# Altium footprint library XU-GENARAL PCB .PcbLib: 1176 footprints (part 28 of 75)
Each footprint in its own frame and in the unit in brackets; x right, y up, seen from the top. Pads: shape width x height; smd on the part's side, far side on the other; paste and mask are expansions set on the pad; w line width, h text height; cw(c..) or ccw(c..) is an arc to the next point about the centre after c.
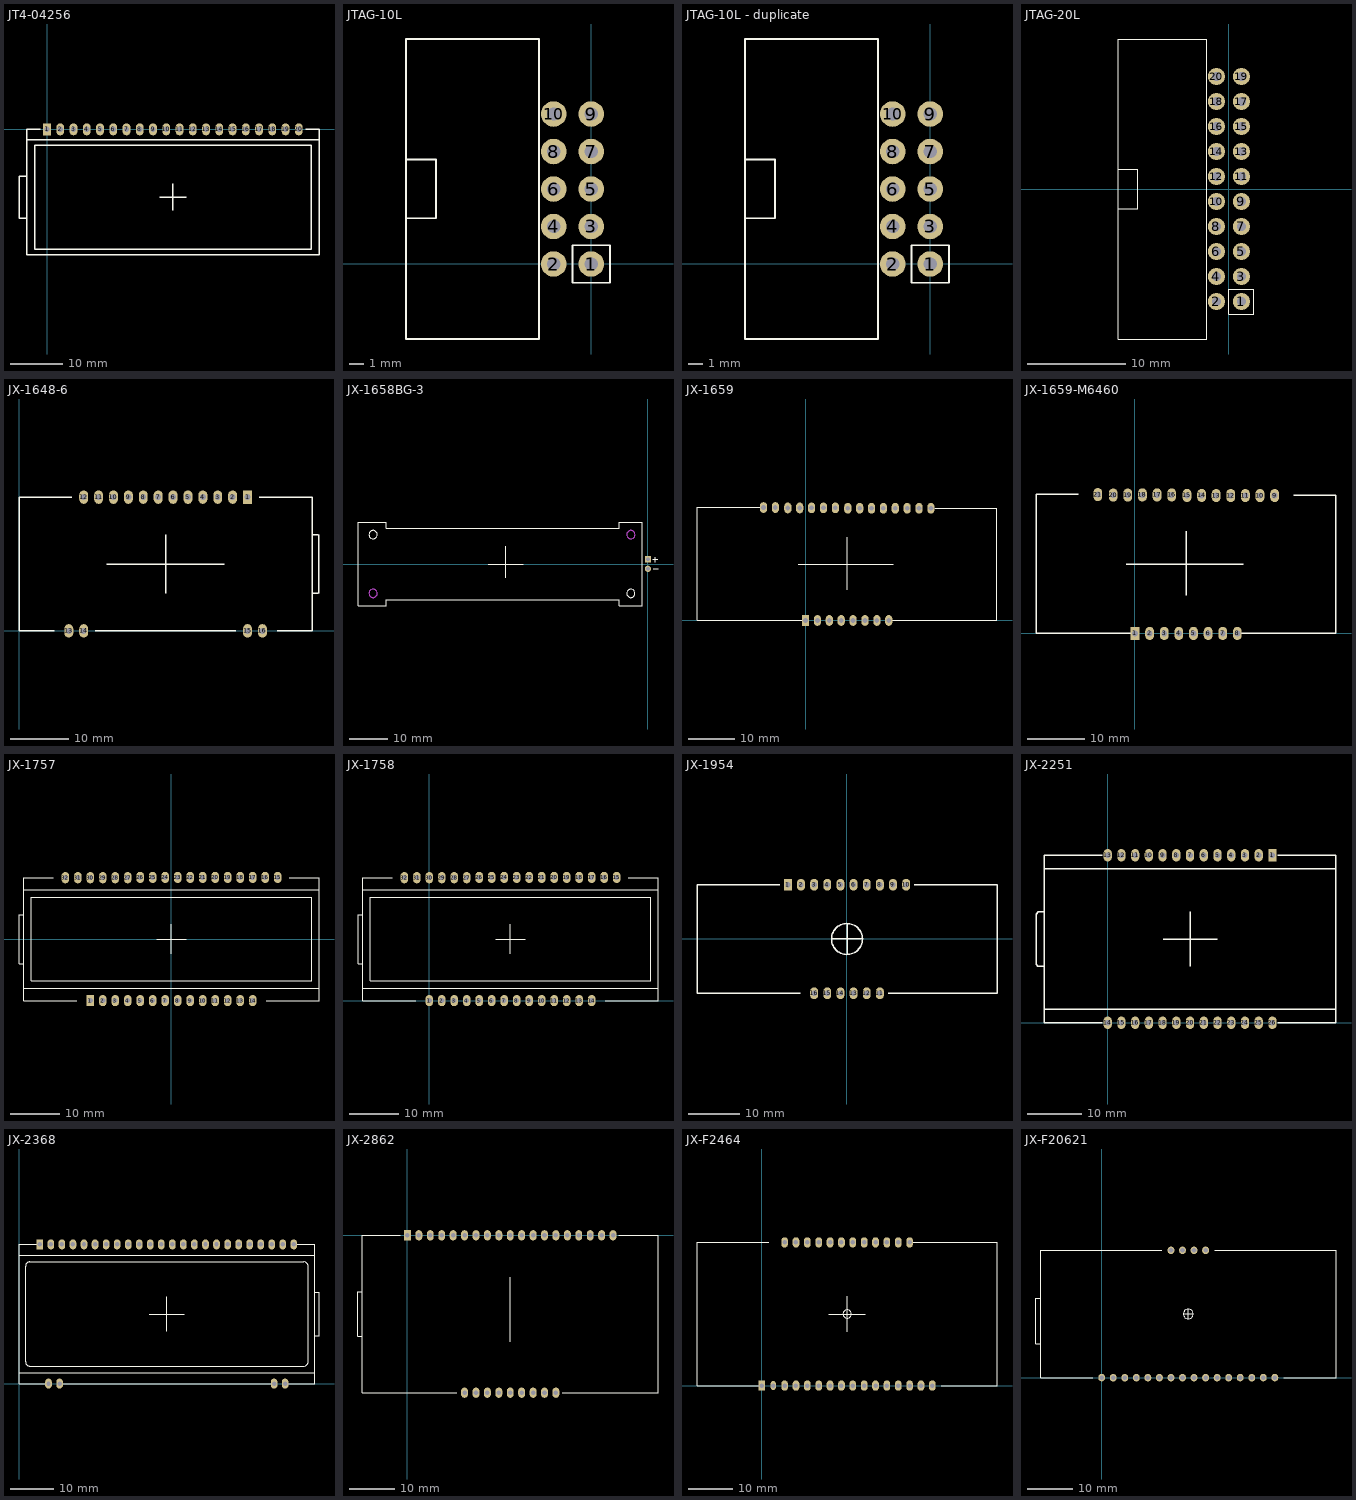
[diagram p27: the footprints below, top view; thin cyan lines are the x and y axes]

## JT4-04256 [mil]
pads (20):
  rect 59.05x90 hole 40: 1(0,0)
  oval 59.05x90 hole 40: 2(100,0) 3(200,0) 4(300,0) 5(400,0) 6(500,0) 7(600,0) 8(700,0) 9(800,0) 10(900,0) 11(1000,0) 12(1100,0) 13(1200,0) 14(1300,0) 15(1400,0) 16(1500,0) 17(1600,0) 18(1700,0) 19(1800,0) 20(1900,0)
Top Overlay:
  lines w10: -152.36,-669.29 -211.42,-669.29 -211.42,-354.33 -152.36,-354.33 ; -52.36,0 -152.36,0 -152.36,-78.74 ; 850,-511.81 1050,-511.81 ; 950,-611.81 950,-411.81 ; 1952.36,0 2052.36,0 2052.36,-78.74 ; -152.36,-78.74 -152.36,-944.88 2052.36,-944.88 2052.36,-78.74 ; -152.36,-78.74 2052.36,-78.74 ; -93.31,-905.51 1993.31,-905.51 1993.31,-118.11 -93.31,-118.11 -93.31,-905.51

## JTAG-10L [mil]
pads (10):
  round 68 hole 35: 1(0.06,-0.03) 2(-99.94,-0.03) 3(0.06,99.97) 4(-99.94,99.97) 5(0.06,199.97) 6(-99.94,199.97) 7(0.06,299.97) 8(-99.94,299.97) 9(0.06,399.97) 10(-99.94,399.97)
Top Overlay:
  lines w5: -493.64,-191.03 -493.64,-151.03 ; -493.64,121.97 -413.94,121.97 -413.94,278.97 -493.64,278.97 ; -493.64,-200.03 -139.31,-200.03 -139.31,599.97 -493.64,599.97 -493.64,-200.03 ; -49.94,-50.03 50.06,-50.03 50.06,49.97 -49.94,49.97 -49.94,-50.03

## JTAG-10L - duplicate [mil]
pads (10):
  round 68 hole 35: 1(0.06,-0.03) 2(-99.94,-0.03) 3(0.06,99.97) 4(-99.94,99.97) 5(0.06,199.97) 6(-99.94,199.97) 7(0.06,299.97) 8(-99.94,299.97) 9(0.06,399.97) 10(-99.94,399.97)
Top Overlay:
  lines w5: -493.64,-191.03 -493.64,-151.03 ; -493.64,121.97 -413.94,121.97 -413.94,278.97 -493.64,278.97 ; -493.64,-200.03 -139.31,-200.03 -139.31,599.97 -493.64,599.97 -493.64,-200.03 ; -49.94,-50.03 50.06,-50.03 50.06,49.97 -49.94,49.97 -49.94,-50.03

## JTAG-20L [mil]
pads (20):
  round 68 hole 35: 1(50,-450) 2(-50,-450) 3(50,-350) 4(-50,-350) 5(50,-250) 6(-50,-250) 7(50,-150) 8(-50,-150) 9(50,-50) 10(-50,-50) 11(50,50) 12(-50,50) 13(50,150) 14(-50,150) 15(50,250) 16(-50,250) 17(50,350) 18(-50,350) 19(50,450) 20(-50,450)
Top Overlay:
  lines w5: -443.7,-391 -443.7,-351 ; -443.7,-78 -364,-78 -364,79 -443.7,79 ; -443.7,-600 -443.7,600 -89.37,600 -89.37,-600 -443.7,-600 ; 0,-500 0,-400 100,-400 100,-500 0,-500

## JX-1648-6 [mil]
pads (16):
  rect 60x90 hole 40: 1(1534.25,897.64)
  oval 60x90 hole 40: 2(1434.25,897.64) 3(1334.25,897.64) 4(1234.25,897.64) 5(1134.25,897.64) 6(1034.25,897.64) 7(934.25,897.64) 8(834.25,897.64) 9(734.25,897.64) 10(634.25,897.64) 11(534.25,897.64) 12(434.25,897.64) 13(334.25,0) 14(434.25,0) 15(1534.25,0) 16(1634.25,0)
Top Overlay:
  lines w10: 0,0 236.22,0 ; 0.04,0 0.04,897.64 ; 0.16,897.64 354.33,897.64 ; 511.81,0 1456.69,0 ; 590.55,448.82 1377.95,448.82 ; 984.25,251.97 984.25,645.67 ; 1614.17,897.64 1968.5,897.64 1968.5,0 1732.28,0 ; 1968.5,251.97 2007.87,251.97 ; 1968.5,645.67 2007.87,645.67 ; 2014,251.97 2014,645.67

## JX-1658BG-3 [mil]
pads (2):
  rect 65x65 hole 40: A(0,50)
  round 65 hole 40: K(0,-50)
Top Overlay:
  circle w5: c-2854.31,305 r43.31
  circle w5: c-177.31,-305 r43.31
  lines w5: -1659,0 -1293,0 ; -1477,-145 -1477,183 -1477,0 ; 52,47 103,47 ; 57,-48 105,-48 ; 78,20 78,68 ; -3011.81,-433.07 -3011.81,433.07 -2716.54,433.07 -2716.54,374.02 -295.28,374.02 -295.28,433.07 -59.05,433.07 -59.05,-433.07 -295.28,-433.07 -295.28,-374.02 -2716.54,-374.02 -2716.54,-433.07 -3011.81,-433.07
Keep-Out Layer:
  circle w5: c-177.17,305.12 r43.31
  circle w5: c-2854.33,-305.12 r43.31
Mechanical 1:
  circle w5: c-2854.33,-305.12 r43.31
  circle w5: c-177.16,305.12 r43.31

## JX-1659 [mil]
pads (23):
  rect 60x90 hole 40: 1(0,0)
  oval 60x90 hole 40: 2(100,0) 3(200,0) 4(300,0) 5(400,0) 6(500,0) 7(600,0) 8(700,0) 9(1054.82,943.28) 10(954.82,943.28) 11(854.82,943.28) 12(754.82,943.28) 13(654.82,943.28) 14(554.82,943.28) 15(455.64,943.57) 16(355.64,943.57) 17(250.82,947.28) 18(150.82,947.28) 19(50.82,947.28) 20(-49.18,946.29) 21(-149.18,946.29) 22(-254,950) 23(-354,950)
Top Overlay:
  lines w10: -387.18,953.28 -913.06,953.28 -913.18,953.16 -913.18,943.28 -913.18,1.28 -911.9,0 0,0 ; -60,473.64 740,473.64 ; 350,260 350,700 ; 700,0 1609.54,0 1610.82,1.28 1610.82,945.28 1086.82,945.28

## JX-1659-M6460 [mil]
pads (21):
  rect 60x90 hole 40: 1(0,0)
  oval 60x90 hole 40: 2(100,0) 3(200,0) 4(300,0) 5(400,0) 6(500,0) 7(600,0) 8(700,0) 9(954.82,943.28) 10(854.82,943.28) 11(754.82,943.28) 12(654.82,943.28) 13(554.82,943.28) 14(455.64,943.57) 15(355.64,943.57) 16(250.82,947.28) 17(150.82,947.28) 18(50.82,947.28) 19(-49.18,946.29) 20(-149.18,946.29) 21(-254,950)
Top Overlay:
  lines w10: -676.96,1.28 -676.96,953.28 ; -676.84,953.28 -387.18,953.28 ; -675.68,0 0,0 ; -60,473.64 740,473.64 ; 350,260 350,700 ; 700,0 1373.32,0 ; 1086.82,945.28 1374.6,945.28 1374.6,1.28

## JX-1757 [mil]
pads (32):
  rect 60x90 hole 40: 1(-649.9,-492)
  oval 60x90 hole 40: 2(-549.9,-492) 3(-449.9,-492) 4(-349.9,-492) 5(-249.9,-492) 6(-149.9,-492) 7(-49.9,-492) 8(50.1,-492) 9(150.1,-492) 10(250.1,-492) 11(350.1,-492) 12(450.1,-492) 13(550.1,-492) 14(650.1,-492) 15(850.1,494.47) 16(750.1,494.47) 17(650.1,494.47) 18(550.1,494.47) 19(450.1,494.47) 20(350.1,494.47) 21(250.1,494.47) 22(150.1,494.47) 23(50.1,494.47) 24(-49.9,494.47) 25(-149.9,494.47) 26(-249.9,494.47) 27(-349.9,492.25) 28(-449.9,492.25) 29(-549.9,492.25) 30(-649.9,492.25) 31(-749.9,492.25) 32(-849.9,492.25)
Top Overlay:
  lines w10: -1181,-196.72 -1220.37,-196.72 -1220.37,196.98 -1181,196.98 ; -944.78,492.25 -1181,492.25 -1181,393.83 ; -757.37,-492 -1181,-492 -1181,-393.57 ; -118.01,0.13 118.21,0.13 ; 0.1,-117.98 0.1,118.24 ; 757.38,-492 1181.2,-492 1181.2,-394.05 ; 944.98,492.25 1181.2,492.25 1181.2,393.83 ; 1122,-334.52 1122,334.77 ; 1122.15,-334.52 -1121.94,-334.52 -1121.94,334.77 1122.15,334.77 ; -1181,-393.57 1181.2,-393.57 1181.2,393.83 ; -1181,-393.57 -1181,393.83 ; -1181,393.83 1181.2,393.83

## JX-1758 [mil]
pads (32):
  oval 60x90 hole 40: 1(0,0) 2(100,0) 3(200,0) 4(300,0) 5(400,0) 6(500,0) 7(600,0) 8(700,0) 9(800,0) 10(900,0) 11(1000,0) 12(1100,0) 13(1200,0) 14(1300,0) 15(1500,986.47) 16(1400,986.47) 17(1300,986.47) 18(1200,986.47) 19(1100,986.47) 20(1000,986.47) 21(900,986.47) 22(800,986.47) 23(700,986.47) 24(600,986.47) 25(500,986.47) 26(400,986.47) 27(300,984.25) 28(200,984.25) 29(100,984.25) 30(0,984.25) 31(-100,984.25) 32(-200,984.25)
Top Overlay:
  lines w10: -531.1,295.28 -570.47,295.28 -570.47,688.98 -531.1,688.98 ; -294.88,984.25 -531.1,984.25 -531.1,885.83 ; -107.47,0 -531.1,0 -531.1,98.42 ; 531.89,492.13 768.11,492.13 ; 650,374.02 650,610.24 ; 1407.28,0 1831.1,0 1831.1,97.95 ; 1594.88,984.25 1831.1,984.25 1831.1,885.83 ; 1771.9,157.48 1771.9,826.77 ; 1772.05,157.48 -472.05,157.48 -472.05,826.77 1772.05,826.77 ; -531.1,98.42 1831.1,98.42 1831.1,885.83 ; -531.1,98.42 -531.1,885.83 ; -531.1,885.83 1831.1,885.83

## JX-1954 [mil]
pads (16):
  rect 60x90 hole 40: 1(-448.27,413.39)
  oval 60x90 hole 40: 2(-348.27,413.39) 3(-248.27,413.39) 4(-148.27,413.39) 5(-48.27,413.39) 6(51.73,413.39) 7(151.73,413.39) 8(251.73,413.39) 9(351.73,413.39) 10(451.73,413.39) 11(251.73,-413.39) 12(151.73,-413.39) 13(51.73,-413.39) 14(-48.27,-413.39) 15(-148.27,-413.39) 16(-248.27,-413.39)
Top Overlay:
  circle w10: c1.73,0 r118.11
  lines w10: -1140,-413.39 -352.6,-413.39 ; -1140,413.39 -510.08,413.39 ; -1139.96,-413.39 -1139.96,413.39 ; -116.38,0 119.84,0 ; 1.73,-118.11 1.73,118.11 ; 316.69,-413.39 1143.46,-413.39 1143.46,413.39 513.54,413.39

## JX-2251 [mil]
pads (26):
  rect 60x90 hole 40: 1(1200,1220.47)
  oval 60x90 hole 40: 2(1100,1220.47) 3(1000,1220.47) 4(900,1220.47) 5(800,1220.47) 6(700,1220.47) 7(600,1220.47) 8(500,1220.47) 9(400,1220.47) 10(300,1220.47) 11(200,1220.47) 12(100,1220.47) 13(0,1220.47) 14(0,0) 15(100,0) 16(200,0) 17(300,0) 18(400,0) 19(500,0) 20(600,0) 21(700,0) 22(800,0) 23(900,0) 24(1000,0) 25(1100,0) 26(1200,0)
Top Overlay:
  lines w10: -466.99,807.09 -506.05,807 -522.05,791 -522.05,425 -510.05,413 -462.99,413.39 ; -462.99,94.42 -462.99,0 -39.37,0 ; -462.99,1124.51 -462.99,1220.47 -39.37,1220.47 ; 403.15,610.24 796.85,610.24 ; 600,413.39 600,807.09 ; 1239.37,0 1662.99,0 ; 1239.37,1220.47 1662.99,1220.47 1662.99,1122.51 ; 1662.99,0.01 1663,0 ; 1662.99,0.01 1662.99,98.42 ; 1662.99,98.42 1662.99,1122.05 -462.99,1122.05 -462.99,98.42 1662.99,98.42

## JX-2368 [mil]
pads (28):
  rect 60x90 hole 40: 1(188.58,1259.84)
  oval 60x90 hole 40: 2(288.58,1259.84) 3(388.58,1259.84) 4(488.58,1259.84) 5(588.58,1259.84) 6(688.58,1259.84) 7(788.58,1259.84) 8(888.58,1259.84) 9(988.58,1259.84) 10(1088.58,1259.84) 11(1188.58,1259.84) 12(1288.58,1259.84) 13(1388.58,1259.84) 14(1488.58,1259.84) 15(1588.58,1259.84) 16(1688.58,1259.84) 17(1788.58,1259.84) 18(1888.58,1259.84) 19(1988.58,1259.84) 20(2088.58,1259.84) 21(2188.58,1259.84) 22(2288.58,1259.84) 23(2388.58,1259.84) 24(2488.58,1259.84) 25(2409.84,0) 26(2309.84,0) 27(367.32,0) 28(267.32,0)
Top Overlay:
  lines w5: 59.05,196.85 ccw(c98.42,196.85) 98.42,157.48 2578.74,157.48 ccw(c2578.74,196.85) 2618.11,196.85 2618.11,1062.99 ccw(c2578.74,1062.99) 2578.74,1102.36 98.42,1102.36 ccw(c98.42,1062.99) 59.05,1062.99 59.05,196.85
  lines w10: 0,98.42 2677.16,98.42 ; 0.01,1161.42 2677.16,1161.42 ; 188.58,1259.84 0,1259.84 0,0 239.76,0 ; 394,0 2288,0 ; 1181.1,629.92 1496.06,629.92 ; 1338.58,472.44 1338.58,787.4 ; 2437.4,0 2677.16,0 2677.16,1259.84 2488.58,1259.84 ; 2677.24,433.07 2716.53,433.07 2716.53,826.77 2677.39,826.77

## JX-2862 [mil]
pads (28):
  rect 60x90 hole 40: 1(0,0)
  oval 60x90 hole 40: 2(100,0) 3(200,0) 4(300,0) 5(400,0) 6(500,0) 7(600,0) 8(700,0) 9(800,0) 10(900,0) 11(1000,0) 12(1100,0) 13(1200,0) 14(1300,0) 15(1400,0) 16(1500,0) 17(1600,0) 18(1700,0) 19(1800,0) 20(1300,-1378) 21(1200,-1378) 22(1100,-1378) 23(1000,-1378) 24(900,-1378) 25(800,-1378) 26(700,-1378) 27(600,-1378) 28(500,-1378)
Top Overlay:
  lines w4: -393.7,-1378 433.07,-1377.95 ; -393.7,-1377.95 -393.7,0 -62,0 ; -393.7,-885.83 -433.07,-885.83 -433.07,-492.13 -393.7,-492.13 ; 1356,-1377.95 2193.7,-1377.95 2193.7,0 1849,0
  lines w10: 900,-934 900,-369

## JX-F2464 [mil]
pads (28):
  rect 59.05x90 hole 40: 1(0,0)
  oval 45x80 hole 40: 2(100,0)
  oval 59.05x90 hole 40: 3(200,0) 4(300,0) 5(400,0) 6(500,0) 7(600,0) 8(700,0) 9(800,0) 10(900,0) 11(1000,0) 12(1100,0) 13(1200,0) 14(1300,0) 15(1400,0) 16(1500,0) 17(1300,1259.84) 18(1200,1259.84) 19(1100,1259.84) 20(1000,1259.84) 21(900,1259.84) 22(800,1259.84) 23(700,1259.84) 24(600,1259.84) 25(500,1259.84) 26(400,1259.84) 27(300,1259.84) 28(200,1259.84)
Top Overlay:
  circle w5: c750,629.92 r36.8
  lines w5: 590.55,629.92 750,629.92 ; 750,472.44 750,629.92 ; 750,787.4 750,629.92 ; 907.48,629.92 750,629.92
  lines w10: -570.87,1259.84 59.16,1259.84 ; -568.9,1259.84 -568.9,0 0,0 ; 1300,1259.84 2068.9,1259.84 2068.9,0 1578.74,0

## JX-F20621 [mil]
pads (20):
  oval 59.06x65 hole 40: 1(0,0) 2(100,-1) 3(200,-1) 4(300,-1) 5(400,-1) 6(500,-1) 7(600,-1) 8(700,-1) 9(800,-1) 10(900,-1) 11(1000,-1) 12(1100,-1) 13(1200,0) 14(1300,-1) 15(1400,0) 16(1500,0) 17(900,1102.36) 18(800,1102.36) 19(700,1102.36) 20(600,1102.36)
Top Overlay:
  circle w5: c750,551.18 r41.99
  lines w5: 710.47,551.18 750.47,551.18 ; 750,510.47 750,551.18 ; 750,589.53 750,551.18 ; 791.99,551.18 750,551.18
  lines w10: -529.53,294.28 -568.9,294.28 -568.9,687.98 -529.53,687.98 ; -78.74,0 -529.53,0 -529.53,1102.36 521.26,1102.36 ; 978.74,1102.36 2027.17,1102.36 ; 1578.74,0 2029.53,0 2029.53,1102.36